# Altium footprint library main.PcbLib: 217 footprints (part 5 of 14)
Each footprint in its own frame and in the unit in brackets; x right, y up, seen from the top. Pads: shape width x height; smd on the part's side, far side on the other; paste and mask are expansions set on the pad; w line width, h text height; cw(c..) or ccw(c..) is an arc to the next point about the centre after c.
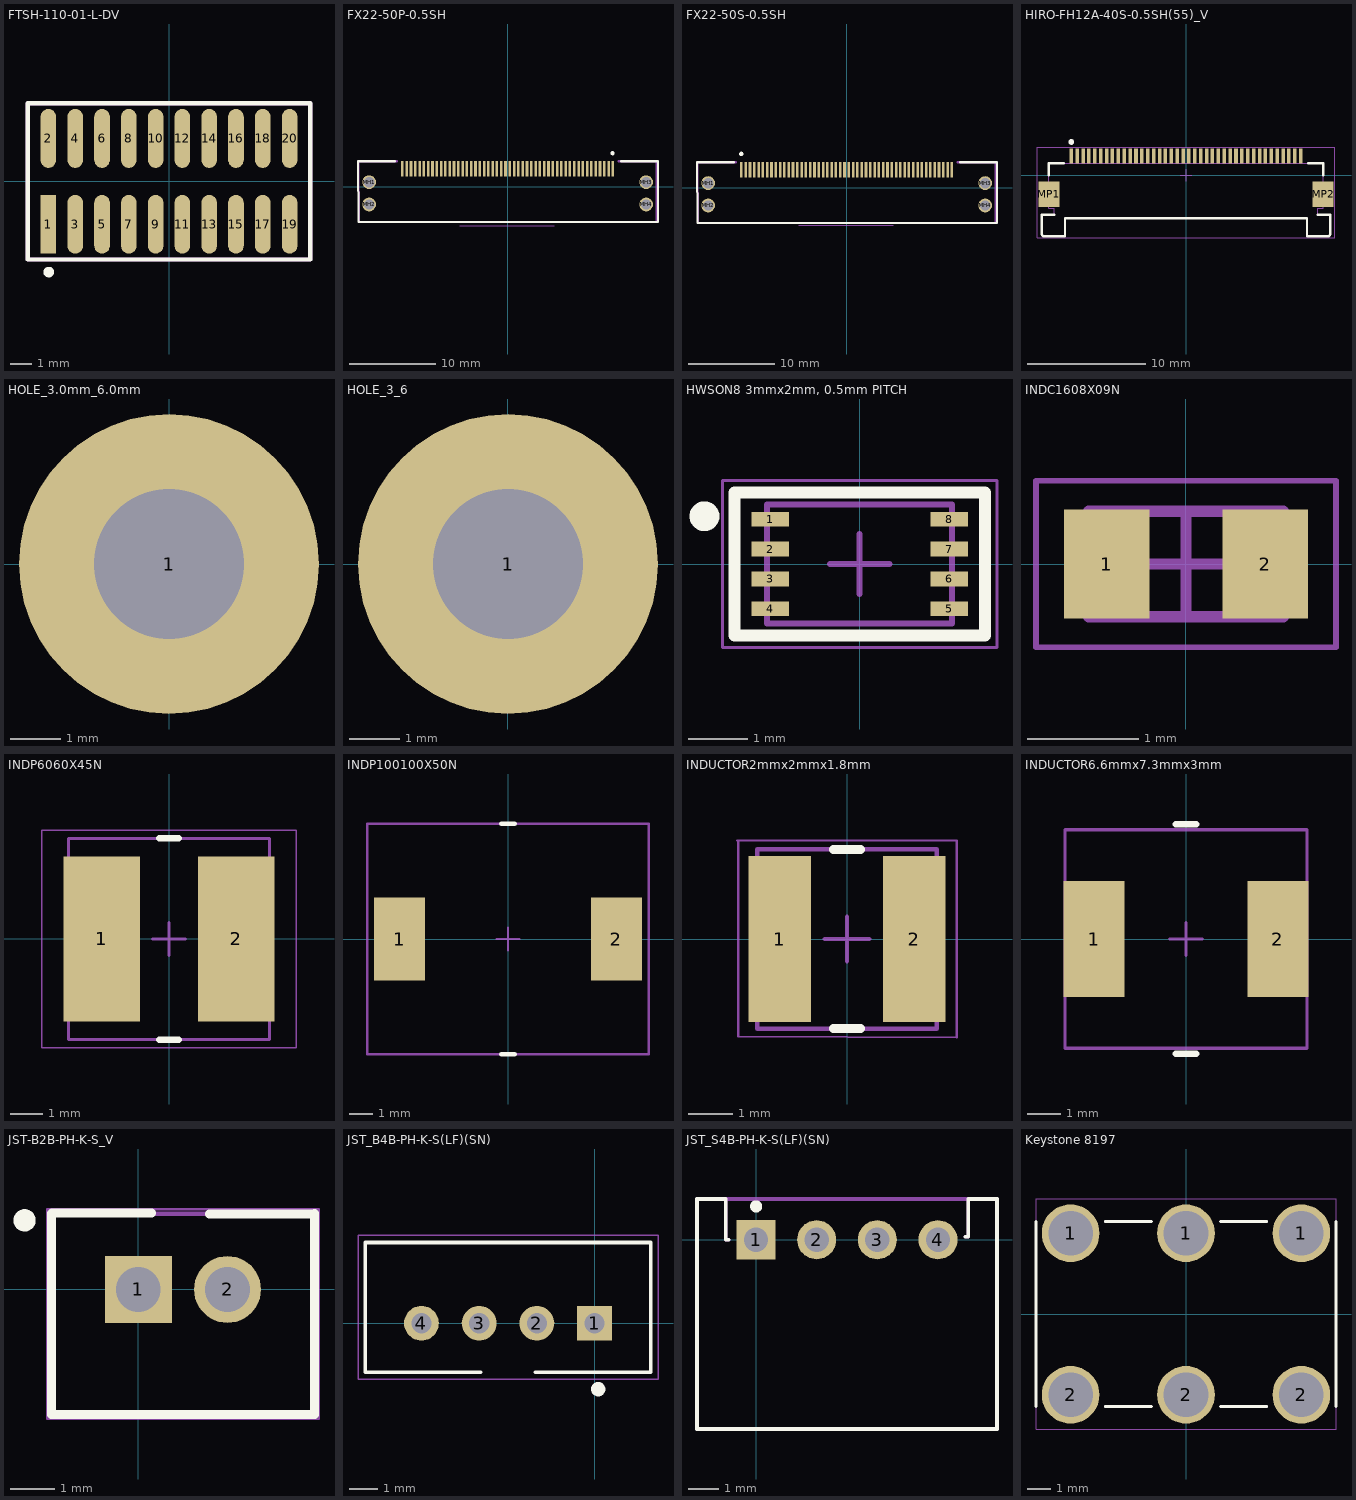
[diagram p4: the footprints below, top view; thin cyan lines are the x and y axes]

## FTSH-110-01-L-DV [mm] "FTSH-110-01-L-DV"
height 5.4
pads (20):
  rect 0.74x2.79 smd paste-1000 mask+0: 1(-5.715,-2.035)
  oval 0.74x2.79 smd paste-1000 mask+0: 2(-5.715,2.035) 3(-4.445,-2.035) 4(-4.445,2.035) 5(-3.175,-2.035) 6(-3.175,2.035) 7(-1.905,-2.035) 8(-1.905,2.035) 9(-0.635,-2.035) 10(-0.635,2.035) 11(0.635,-2.035) 12(0.635,2.035) 13(1.905,-2.035) 14(1.905,2.035) 15(3.175,-2.035) 16(3.175,2.035) 17(4.445,-2.035) 18(4.445,2.035) 19(5.715,-2.035) 20(5.715,2.035)
Top Overlay:
  circle w0.25: c-5.7,-4.3 r0.125
  lines w0.2: -6.7,-3.7 6.7,-3.7 6.7,3.7 -6.7,3.7 -6.7,-3.7
Mechanical 7:
  text ".Designator" at -7.409,-1.172 h1.52
Mechanical 13:
  lines w0.2: -6.7,-3.7 6.7,-3.7 6.7,3.7 -6.7,3.7 -6.7,-3.7
Mechanical 15:
  lines w0.2: -6.7,-3.7 6.7,-3.7 6.7,3.7 -6.7,3.7 -6.7,-3.7
3D body "FTSH-110-01-L-DV.stp": height 5.96, standoff -0.01, extent -6.35,-2.921 6.35,2.921

## FX22-50P-0.5SH [mm] "FX22-50P-0.5SH"
pads (54):
  rect 0.3x1.8 smd: 1(12.25,2.075) 2(11.75,2.075) 3(11.25,2.075) 4(10.75,2.075) 5(10.25,2.075) 6(9.75,2.075) 7(9.25,2.075) 8(8.75,2.075) 9(8.25,2.075) 10(7.75,2.075) 11(7.25,2.075) 12(6.75,2.075) 13(6.25,2.075) 14(5.75,2.075) 15(5.25,2.075) 16(4.75,2.075) 17(4.25,2.075) 18(3.75,2.075) 19(3.25,2.075) 20(2.75,2.075) 21(2.25,2.075) 22(1.75,2.075) 23(1.25,2.075) 24(0.75,2.075) 25(0.25,2.075) 26(-0.25,2.075) 27(-0.75,2.075) 28(-1.25,2.075) 29(-1.75,2.075) 30(-2.25,2.075) 31(-2.75,2.075) 32(-3.25,2.075) 33(-3.75,2.075) 34(-4.25,2.075) 35(-4.75,2.075) 36(-5.25,2.075) 37(-5.75,2.075) 38(-6.25,2.075) 39(-6.75,2.075) 40(-7.25,2.075) 41(-7.75,2.075) 42(-8.25,2.075) 43(-8.75,2.075) 44(-9.25,2.075) 45(-9.75,2.075) 46(-10.25,2.075) 47(-10.75,2.075) 48(-11.25,2.075) 49(-11.75,2.075) 50(-12.25,2.075)
  round 1.6 hole 1.2: MH1(-16.125,0.525) MH2(-16.125,-2.075) MH3(16.125,0.525) MH4(16.125,-2.075)
Top Overlay:
  circle w0.25: c12.2,3.9 r0.125
  lines w0.254: -13.1,2.964 -17.424,2.964 -17.358,-4.1 17.5,-4.1 17.5,2.964 13.2,2.964
Mechanical 5:
  lines w0.1: -5.6,-4.575 5.4,-4.575
  text "PCB EDGE" at 5.6,-4 h1
Mechanical 7:
  text ".Designator" at -5.779,-3.111 h1.52
Mechanical 15:
  lines w0.254: -12.885,2.964 -17.362,2.964 -17.296,-4.1 17.362,-4.1 17.362,2.964 12.927,2.964
3D body "FX22-50P-0.5SH.stp": height 4.2, standoff -1.35, extent -16.74,-10.759 16.76,2.891

## FX22-50S-0.5SH [mm] "FX22-50S-0.5SH"
pads (54):
  rect 0.3x1.8 smd: 1(-12.25,2.075) 2(-11.75,2.075) 3(-11.25,2.075) 4(-10.75,2.075) 5(-10.25,2.075) 6(-9.75,2.075) 7(-9.25,2.075) 8(-8.75,2.075) 9(-8.25,2.075) 10(-7.75,2.075) 11(-7.25,2.075) 12(-6.75,2.075) 13(-6.25,2.075) 14(-5.75,2.075) 15(-5.25,2.075) 16(-4.75,2.075) 17(-4.25,2.075) 18(-3.75,2.075) 19(-3.25,2.075) 20(-2.75,2.075) 21(-2.25,2.075) 22(-1.75,2.075) 23(-1.25,2.075) 24(-0.75,2.075) 25(-0.25,2.075) 26(0.25,2.075) 27(0.75,2.075) 28(1.25,2.075) 29(1.75,2.075) 30(2.25,2.075) 31(2.75,2.075) 32(3.25,2.075) 33(3.75,2.075) 34(4.25,2.075) 35(4.75,2.075) 36(5.25,2.075) 37(5.75,2.075) 38(6.25,2.075) 39(6.75,2.075) 40(7.25,2.075) 41(7.75,2.075) 42(8.25,2.075) 43(8.75,2.075) 44(9.25,2.075) 45(9.75,2.075) 46(10.25,2.075) 47(10.75,2.075) 48(11.25,2.075) 49(11.75,2.075) 50(12.25,2.075)
  round 1.6 hole 1.2: MH1(-16.125,0.525) MH2(-16.125,-2.075) MH3(16.125,0.525) MH4(16.125,-2.075)
Top Overlay:
  circle w0.25: c-12.271,3.93 r0.125
  lines w0.254: -13.1,2.964 -17.424,2.964 -17.358,-4.1 17.5,-4.1 17.5,2.964 13.2,2.964
Mechanical 5:
  lines w0.1: -5.6,-4.375 5.4,-4.375
  text "PCB EDGE" at 5.6,-4 h1
Mechanical 7:
  text ".Designator" at -5.779,-3.111 h1.52
Mechanical 15:
  lines w0.254: -12.885,2.964 -17.362,2.964 -17.296,-4.1 17.362,-4.1 17.362,2.964 12.927,2.964
3D body "FX22-50S-0.5SH.stp": height 4.25, standoff -1.3, extent -16.74,-4.14 16.76,2.71

## HIRO-FH12A-40S-0.5SH(55)_V [mm] "SMD, 40-Leads, Body 24.5x6.2mm, Pitch 0.5mm"
height 2
pads (42):
  rect 0.3x1.3 smd paste-0.025: 1(-9.75,1.625) 2(-9.25,1.625) 3(-8.75,1.625) 4(-8.25,1.625) 5(-7.75,1.625) 6(-7.25,1.625) 7(-6.75,1.625) 8(-6.25,1.625) 9(-5.75,1.625) 10(-5.25,1.625) 11(-4.75,1.625) 12(-4.25,1.625) 13(-3.75,1.625) 14(-3.25,1.625) 15(-2.75,1.625) 16(-2.25,1.625) 17(-1.75,1.625) 18(-1.25,1.625) 19(-0.75,1.625) 20(-0.25,1.625) 21(0.25,1.625) 22(0.75,1.625) 23(1.25,1.625) 24(1.75,1.625) 25(2.25,1.625) 26(2.75,1.625) 27(3.25,1.625) 28(3.75,1.625) 29(4.25,1.625) 30(4.75,1.625) 31(5.25,1.625) 32(5.75,1.625) 33(6.25,1.625) 34(6.75,1.625) 35(7.25,1.625) 36(7.75,1.625) 37(8.25,1.625) 38(8.75,1.625) 39(9.25,1.625) 40(9.75,1.625)
  rect 1.8x2.2 smd: MP1(-11.65,-1.625) MP2(11.65,-1.625)
Top Overlay:
  circle w0.25: c-9.75,2.825 r0.125
  lines w0.2: -11.675,-0.025 -11.675,1 -10.4,1 ; -11.2,-3.35 -12.25,-3.35 -12.25,-5 ccw(c-12.05,-5) -12.05,-5.2 -10.285,-5.2 -10.285,-3.67 10.285,-3.67 10.285,-5.2 12.05,-5.2 ccw(c12.05,-5) 12.25,-5 12.25,-3.35 11.2,-3.35 ; 10.4,1 11.675,1 11.675,-0.025
Mechanical 7:
  text ".Designator" at -6.994,-3.15 h1.52
Mechanical 13:
  lines w0.1: -12.25,-5 ccw(c-12.05,-5) -12.05,-5.2 -10.285,-5.2 -10.285,-3.67 10.285,-3.67 10.285,-5.2 12.05,-5.2 ccw(c12.05,-5) 12.25,-5 12.25,-3.35 11.2,-3.35 11.2,-2.8 11.675,-2.8 11.675,1 -11.675,1 -11.675,-2.8 -11.2,-2.8 -11.2,-3.35 -12.25,-3.35 -12.25,-5
Mechanical 15:
  lines w0.05: -12.65,-5.3 -12.65,2.375 12.65,2.375 12.65,-5.3 -12.65,-5.3
  lines w0.1: -0.5,0 0.5,0 ; 0,-0.5 0,0.5
3D body "FH12A-40S-0.5SH.stp": height 2.15, standoff 0, extent -12.25,-5.2 12.25,1.8

## HOLE_3.0mm_6.0mm [mm] "Plated M3 mounting hole"
pads (1):
  round 6 hole 3: 1(0,0)

## HOLE_3_6 [mm] "3 ID / 6 OD"
pads (1):
  round 6 hole 3: 1(0,0)

## HWSON8 3mmx2mm, 0.5mm PITCH [mm] "HWSON8 3mmx2mm, 0.5mm PITCH"
height 1.1
pads (8):
  rect 0.625x0.25 smd: 1(-1.5,0.75) 2(-1.5,0.25) 3(-1.5,-0.25) 4(-1.5,-0.75) 5(1.5,-0.75) 6(1.5,-0.25) 7(1.5,0.25) 8(1.5,0.75)
Top Overlay:
  circle w0.25: c-2.6,0.8 r0.125
  lines w0.2: -2.1,-1.2 2.1,-1.2 2.1,1.2 -2.1,1.2 -2.1,-1.2
Mechanical 7:
  text ".Designator" at -1.7,-0.7 h1.52
Mechanical 13:
  lines w0.1: -1.55,-1 1.55,-1 1.55,1 -1.55,1 -1.55,-1
Mechanical 15:
  lines w0.05: -2.3,-1.4 2.3,-1.4 2.3,1.4 -2.3,1.4 -2.3,-1.4
  lines w0.1: -0.5,0 0.5,0 ; 0,-0.5 0,0.5
3D body "User Library-HWSON8-2x3x0_80.STEP": height 0.75, standoff -0.05, extent -1.5,-1 1.5,1

## INDC1608X09N [mm] "Chip Inductor, 2-Leads, Body 1.60x0.80mm, IPC Medium Density"
height 0.95
pads (2):
  rect 0.77x0.98 smd: 1(-0.715,0) 2(0.715,0)
Mechanical 7:
  text ".Designator" at -1.15,-0.4 h1
Mechanical 13:
  lines w0.1: -0.875,-0.475 0.875,-0.475 0.875,0.475 -0.875,0.475 -0.875,-0.475
Mechanical 15:
  lines w0.05: -1.35,-0.75 1.35,-0.75 1.35,0.75 -1.35,0.75 -1.35,-0.75
  lines w0.1: -0.475,0 0.475,0 ; 0,-0.475 0,0.475
3D body: height 0.95, standoff 0, extent 0.575,-0.475 0.875,0.475
3D body: height 0.95, standoff 0, extent -0.875,-0.475 -0.575,0.475
3D body: height 0.95, standoff 0, extent -0.575,-0.475 0.575,0.475

## INDP6060X45N [mm] "Precision Wire Wound Inductor, 2-Leads, Body 6.00x6.00mm, IPC Medium Density"
height 4.5
pads (2):
  rect 2.35x5.1 smd: 1(-2.075,0) 2(2.075,0)
Top Overlay:
  lines w0.2: -0.3,-3.1 0.3,-3.1 ; -0.3,3.1 0.3,3.1
Mechanical 7:
  text ".Designator" at -2.126,-0.475 h1.52
Mechanical 13:
  lines w0.1: -3.1,-3.1 3.1,-3.1 3.1,3.1 -3.1,3.1 -3.1,-3.1
Mechanical 15:
  lines w0.05: -3.925,-3.35 3.925,-3.35 3.925,3.35 -3.925,3.35 -3.925,-3.35
  lines w0.1: -0.5,0 0.5,0 ; 0,-0.5 0,0.5
3D body "srn6045.stp": height 4.5, standoff 0, extent -3,-3 3,3

## INDP100100X50N [mm] "Precision Wire Wound Inductor, 2-Leads, Body 10.00x10.00mm, IPC Medium Density"
height 5.1
pads (2):
  rect 2.2x3.6 smd: 1(-4.7,0) 2(4.7,0)
Top Overlay:
  lines w0.2: -0.3,-5 0.3,-5 ; -0.3,5 0.3,5
Mechanical 7:
  text ".Designator" at -2.126,-0.475 h1.52
Mechanical 13:
  lines w0.1: -6.1,-5 -6.1,5 6.1,5 6.1,-5 -6.1,-5
Mechanical 15:
  lines w0.05: -6.1,-5 -6.1,5 6.1,5 6.1,-5 -6.1,-5
  lines w0.1: -0.5,0 0.5,0 ; 0,-0.5 0,0.5
3D body "sru1048.stp": height 4.6, standoff -0.2, extent -5,-5 5,5

## INDUCTOR2mmx2mmx1.8mm [mm] "INDUCTOR2mmx2mmx1.8mm"
height 1.8
pads (2):
  rect 1.4x3.7 smd: 1(-1.5,0) 2(1.5,0)
Top Overlay:
  lines w0.2: -0.3,-2 0.3,-2 ; -0.3,2 0.3,2
Mechanical 7:
  text ".Designator" at -2.126,-0.475 h1.52
Mechanical 13:
  lines w0.1: 1.99,-2 -2,-2 -2,2 1.99,2 ; 2,-2 2,2
Mechanical 15:
  lines w0.05: -2.45,2.2 2.45,2.2 2.45,-2.2 -2.43,-2.18 -2.43,2.2
  lines w0.1: -0.5,0 0.5,0 ; 0,-0.5 0,0.5
3D body: height 1.8, standoff 0, extent -2,-2 2,2

## INDUCTOR6.6mmx7.3mmx3mm [mm] "INDUCTOR6.6mmx7.3mmx3mm"
height 3
pads (2):
  rect 1.85x3.5 smd: 1(-2.775,0) 2(2.775,0)
Top Overlay:
  lines w0.2: -0.3,-3.46 0.3,-3.46 ; -0.3,3.46 0.3,3.46
Mechanical 7:
  text ".Designator" at -1.57,-0.58 h1.52
Mechanical 13:
  lines w0.1: -3.65,-3.3 3.65,-3.3 3.65,3.3 -3.65,3.3 -3.65,-3.3
Mechanical 15:
  lines w0.05: -3.65,-3.3 3.65,-3.3 3.65,3.3 -3.65,3.3 -3.65,-3.3
  lines w0.1: -0.5,0 0.5,0 ; 0,-0.5 0,0.5
3D body: height 3, standoff 0, extent -3.65,-3.3 3.65,3.3

## JST-B2B-PH-K-S_V [mm] "Connector, 2-Leads, Body 5.9x4.5mm, Pitch 2mm"
height 6
pads (2):
  rect 1.5x1.5 hole 1: 1(0,0)
  round 1.5 hole 1: 2(2,0)
Top Overlay:
  circle w0.25: c-2.55,1.55 r0.125
  lines w0.2: -1.95,1.7 -1.95,-2.8 3.95,-2.8 3.95,1.7 ; -1.941,1.71 0.3,1.71 ; 1.6,1.692 3.929,1.692
Mechanical 7:
  text ".Designator" at -1.417,-1.899 h1.52
Mechanical 13:
  lines w0.1: -1.95,-2.8 -1.95,1.7 3.95,1.7 3.95,-2.8 -1.95,-2.8
Mechanical 15:
  lines w0.05: -2.05,-2.9 -2.05,1.8 4.05,1.8 4.05,-2.9 -2.05,-2.9
3D body "B2B-PH-K-S(LF)(SN)--3DModel-STEP-56544.STEP": height 6.05, standoff -3.35, extent -1.979,-2.8 3.921,1.7
3D body: height 0, standoff -3.4, extent -0.249,-0.249 0.249,0.249
3D body: height 0, standoff -3.4, extent 1.75,-0.249 2.249,0.25
3D body: height 0.25, standoff 0, extent -2.683,0.212 -2.683,0.212

## JST_B4B-PH-K-S(LF)(SN) [mm]
pads (4):
  rect 1.208x1.208 hole 0.7: 1(0,0)
  round 1.208 hole 0.7: 2(-2,0) 3(-4,0) 4(-6,0)
Top Overlay:
  circle w0.25: c0.127,-2.286 r0.125
  lines w0.127: -3.95,-1.7 -7.95,-1.7 -7.95,2.8 1.95,2.8 1.95,-1.7 -2.05,-1.7
Mechanical 7:
  text ".Designator" at -5.548,-1.037 h1.52
Mechanical 15:
  lines w0.05: -8.2,-1.95 -8.2,3.05 2.2,3.05 2.2,-1.95 -8.2,-1.95
3D body "B4B-PH-K-S(LF)(SN)--3DModel-STEP-56544.STEP": height 6, standoff -3.4, extent -7.95,-1.736 1.95,2.764

## JST_S4B-PH-K-S(LF)(SN) [mm]
height 1.8
pads (4):
  rect 1.29x1.29 hole 0.8: 1(0,0)
  round 1.29 hole 0.8: 2(2,0) 3(4,0) 4(6,0)
Top Overlay:
  circle w0.2: c0,1.1 r0.1
  lines w0.127: -0.9,0 -1,0 -1,1.35 -1.95,1.35 -1.95,-6.25 7.95,-6.25 7.95,1.35 7,1.35 7,0.1 6.9,0.1
Mechanical 7:
  text ".Designator" at -1.195,-4.27 h1.52
Mechanical 15:
  lines w0.127: -0.9,0 -1,0 -1,1.35 -1.95,1.35 ; 6.9,0.1 7,0.1 7,1.35 7.95,1.35 ; -1.95,1.35 7.95,1.35 ; -1.95,1.35 -1.95,-6.25 7.95,-6.25 7.95,1.35
3D body "S4B-PH-K-S.STEP": height 4.9, standoff -3.3, extent -2.025,-6.25 7.875,1.35

## Keystone 8197 [mm] "Keystone 8197"
pads (6):
  round 2.5 hole 1.93: 1(-5,3.5) 1(0,3.5) 1(5,3.5) 2(-5,-3.5) 2(0,-3.5) 2(5,-3.5)
Top Overlay:
  lines w0.127: -6.5,-4 -6.5,4 ; -3.5,-4 -1.5,-4 ; -3.5,4 -1.5,4 ; 1.5,-4 3.5,-4 ; 1.5,4 3.5,4 ; 6.5,-4 6.5,4
Mechanical 7:
  text ".Designator" at -4,-0.5 h0.76
Mechanical 15:
  lines w0.05: -6.5,-5 6.5,-5 6.5,5 -6.5,5 -6.5,-5
3D body "keystone-PN7786.STEP": height 6.68, standoff -5, extent -6.439,-4.516 6.439,4.5